# Altium schematic symbol library IC_Maxim.SchLib: 843 symbols (part 4 of 20) (continued)
## MAX4211BETE (continued)

## MAX4211BETE+
designator U?
High-Side Power Monitor, Open-Drain Outputs, 16-Pin TQFN, -40癈 to +85癈, Pb-Free; DatasheetVersion: Rev 1, May-2005; PackageVersion: revK, 2011; PackageReference: T1644+4; PackageDescription: 16-Pin Thin Quad Flatpack, No-Leads (TQFN), 4 x 4 x 0.75 mm Body, 0.65 mm Pitch, Exposed Pad, Pb-Free; Code_JEDEC: MO-220WGGC; ComponentLink1Description: Manufacturer URL; ComponentLink1URL: http://www.maxim-ic.com; ComponentLink2Description: Datasheet; ComponentLink2URL: http://datasheets.maxim-ic.com/en/ds/MAX4210-MAX4211.pdf; ComponentLink3Description: Package Specification; ComponentLink3URL: http://pdfserv.maxim-ic.com/package_dwgs/21-0139.PDF
footprint QFN16_0.65-PAD(4x4) (Footprint not found)
pins: 1 VCC (power), 2 NC, 3 LE (in), 4 COUT1 (oc), 5 INHIBIT (in), 6 COUT2 (oc), 7 GND (power), 8 CIN2+ (in), 9 CIN2- (in), 10 CIN1+ (in), 11 CIN1- (in), 12 REF (out), 13 POUT (out), 14 IOUT (out), 15 RS- (in), 16 RS+ (in), 17 EP (power)

## MAX4211BEUE
designator U?
High-Side, Power + Current Monitor with 2 Comparators + Reference, 25 V / V Gain, -40 to 85 degC, 16-Pin SOP (U16-2); PartNumber: MAX4211BEUE; Bi-Dir. Curr. Sense: No; Gain: 16.67 V/V, 25 V/V ,40.96 V/V; DatasheetVersion: Rev. 1; PackageVersion: Rev. L, 07/2010; PackageReference: U16-2; PackageDescription: 16-Pin Thin Shrink Small-Outline Package, Body 4.4 x 5 mm, Pitch 0.65 mm; Supplier Part Number 1: MAX4211BEUE-ND; Supplier Part Number 2: 700-MAX4211BEUE-NR; Mounting Technology: Surface Mount; Code_JEDEC: MO-153; ComponentLink1Description: Manufacturer URL; ComponentLink1URL: http://www.maximintegrated.com/; ComponentLink2Description: Datasheet; ComponentLink2URL: http://datasheets.maximintegrated.com/en/ds/MAX4210-MAX4211.pdf; ComponentLink3Description: Package Specification; ComponentLink3URL: http://pdfserv.maximintegrated.com/package_dwgs/21-0066.PDF
footprint TSSOP16_0.65 (Footprint not found)
pins: 1 RS- (in) "Load-Side Connection for External-Sense Resistor", 2 RS+ (in) "Power Connection to External-Sense Resistor and Internal Resistor-Divider", 3 VCC (power) "Power-Supply Voltage. Connect a 0.1礔 bypass capacitor from VCC to GND.", 4 NC "No Connection. Not internally connected.", 5 LE (in) "Latch Enable for Comparator 1. Driving logic low makes the comparator transparent (regular comparator). Driving logic high latches the output.", 6 COUT1 (oc) "Open- Drain Comparator 1 Output. LE  and  INHIBIT control  the comparator 1 output.", 7 INHIBIT (in) "INHIBIT for Comparator 1 Output. Driving logic high inhibits the comparator operation. Drive logic low for normal operation.", 8 COUT2 (oc) "Open-Drain Comparator 2 Output", 9 GND (power) "Ground", 10 CIN2+ (in) "Comparator 2 Positive Input", 11 CIN2- (in) "Comparator 2 Negative Input", 12 CIN1+ (in) "Comparator 1 Positive Input", 13 CIN1- (in) "Comparator 1 Negative Input", 14 REF (out) "1.21V Internal Reference Output", 15 POUT (power) "Power Output Voltage. Voltage output proportional to source power (input voltage multiplied by load current).", 16 IOUT (out) "Current Output Voltage. Voltage output proportional to VSENSE (VRS+ - VRS-) load current."

## MAX4211BEUE+
designator U?
High-Side Power Monitor, Open-Drain Outputs, 16-Pin TSSOP, -40癈 to +85癈, Pb-Free; DatasheetVersion: Rev 1, May-2005; PackageVersion: revL, 2010; PackageReference: U16+2; PackageDescription: 16-Pin Thin Shrink Small-Outline Package, 4.4 mm Body, TSSOP, Pb-Free; Code_JEDEC: MO-153-AB; ComponentLink1Description: Manufacturer URL; ComponentLink1URL: http://www.maxim-ic.com; ComponentLink2Description: Datasheet; ComponentLink2URL: http://datasheets.maxim-ic.com/en/ds/MAX4210-MAX4211.pdf; ComponentLink3Description: Package Specification; ComponentLink3URL: http://pdfserv.maxim-ic.com/package_dwgs/21-0066.PDF
footprint TSSOP16_0.65 (Footprint not found)
pins: 1 RS- (in), 2 RS+ (in), 3 VCC (power), 4 NC, 5 LE (in), 6 COUT1 (oc), 7 INHIBIT (in), 8 COUT2 (oc), 9 GND (power), 10 CIN2+ (in), 11 CIN2- (in), 12 CIN1+ (in), 13 CIN1- (in), 14 REF (out), 15 POUT (out), 16 IOUT (out)

## MAX4211CETE
designator U?
High-Side Power Monitor, Open-Drain Outputs, 16-Pin TQFN, -40癈 to +85癈; DatasheetVersion: Rev 1, May-2005; PackageVersion: revJ, 2011; PackageReference: T1644-4; PackageDescription: 16-Pin Thin Quad Flatpack, No-Leads (TQFN), 4 x 4 x 0.75 mm Body, 0.65 mm Pitch, Exposed Pad; Code_JEDEC: MO-220WGGC; ComponentLink1Description: Manufacturer URL; ComponentLink1URL: http://www.maxim-ic.com; ComponentLink2Description: Datasheet; ComponentLink2URL: http://datasheets.maxim-ic.com/en/ds/MAX4210-MAX4211.pdf; ComponentLink3Description: Package Specification; ComponentLink3URL: http://pdfserv.maxim-ic.com/package_dwgs/21-0139.PDF
footprint QFN16_0.65-PAD(4x4) (Footprint not found)
pins: 1 VCC (power), 2 NC, 3 LE (in), 4 COUT1 (oc), 5 INHIBIT (in), 6 COUT2 (oc), 7 GND (power), 8 CIN2+ (in), 9 CIN2- (in), 10 CIN1+ (in), 11 CIN1- (in), 12 REF (out), 13 POUT (out), 14 IOUT (out), 15 RS- (in), 16 RS+ (in), 17 EP (power)

## MAX4211CETE+
designator U?
High-Side Power Monitor, Open-Drain Outputs, 16-Pin TQFN, -40癈 to +85癈, Pb-Free; DatasheetVersion: Rev 1, May-2005; PackageVersion: revK, 2011; PackageReference: T1644+4; PackageDescription: 16-Pin Thin Quad Flatpack, No-Leads (TQFN), 4 x 4 x 0.75 mm Body, 0.65 mm Pitch, Exposed Pad, Pb-Free; Code_JEDEC: MO-220WGGC; ComponentLink1Description: Manufacturer URL; ComponentLink1URL: http://www.maxim-ic.com; ComponentLink2Description: Datasheet; ComponentLink2URL: http://datasheets.maxim-ic.com/en/ds/MAX4210-MAX4211.pdf; ComponentLink3Description: Package Specification; ComponentLink3URL: http://pdfserv.maxim-ic.com/package_dwgs/21-0139.PDF
footprint QFN16_0.65-PAD(4x4) (Footprint not found)
pins: 1 VCC (power), 2 NC, 3 LE (in), 4 COUT1 (oc), 5 INHIBIT (in), 6 COUT2 (oc), 7 GND (power), 8 CIN2+ (in), 9 CIN2- (in), 10 CIN1+ (in), 11 CIN1- (in), 12 REF (out), 13 POUT (out), 14 IOUT (out), 15 RS- (in), 16 RS+ (in), 17 EP (power)

## MAX4211CEUE
designator U?
High-Side Power Monitor, Open-Drain Outputs, 16-Pin TSSOP, -40癈 to +85癈; DatasheetVersion: Rev 1, May-2005; PackageVersion: revL, 2010; PackageReference: U16-2; PackageDescription: 16-Pin Thin Shrink Small-Outline Package, 4.4 mm Body, TSSOP; Code_JEDEC: MO-153-AB; ComponentLink1Description: Manufacturer URL; ComponentLink1URL: http://www.maxim-ic.com; ComponentLink2Description: Datasheet; ComponentLink2URL: http://datasheets.maxim-ic.com/en/ds/MAX4210-MAX4211.pdf; ComponentLink3Description: Package Specification; ComponentLink3URL: http://pdfserv.maxim-ic.com/package_dwgs/21-0066.PDF
footprint TSSOP16_0.65 (Footprint not found)
pins: 1 RS- (in), 2 RS+ (in), 3 VCC (power), 4 NC, 5 LE (in), 6 COUT1 (oc), 7 INHIBIT (in), 8 COUT2 (oc), 9 GND (power), 10 CIN2+ (in), 11 CIN2- (in), 12 CIN1+ (in), 13 CIN1- (in), 14 REF (out), 15 POUT (out), 16 IOUT (out)

## MAX4211CEUE+
designator U?
High-Side Power Monitor, Open-Drain Outputs, 16-Pin TSSOP, -40癈 to +85癈, Pb-Free; DatasheetVersion: Rev 1, May-2005; PackageVersion: revL, 2010; PackageReference: U16+2; PackageDescription: 16-Pin Thin Shrink Small-Outline Package, 4.4 mm Body, TSSOP, Pb-Free; Code_JEDEC: MO-153-AB; ComponentLink1Description: Manufacturer URL; ComponentLink1URL: http://www.maxim-ic.com; ComponentLink2Description: Datasheet; ComponentLink2URL: http://datasheets.maxim-ic.com/en/ds/MAX4210-MAX4211.pdf; ComponentLink3Description: Package Specification; ComponentLink3URL: http://pdfserv.maxim-ic.com/package_dwgs/21-0066.PDF
footprint TSSOP16_0.65 (Footprint not found)
pins: 1 RS- (in), 2 RS+ (in), 3 VCC (power), 4 NC, 5 LE (in), 6 COUT1 (oc), 7 INHIBIT (in), 8 COUT2 (oc), 9 GND (power), 10 CIN2+ (in), 11 CIN2- (in), 12 CIN1+ (in), 13 CIN1- (in), 14 REF (out), 15 POUT (out), 16 IOUT (out)

## MAX4211DETE
designator U?
High-Side Power Monitor, Open-Drain Outputs, 16-Pin TQFN, -40癈 to +85癈; DatasheetVersion: Rev 1, May-2005; PackageVersion: revJ, 2011; PackageReference: T1644-4; PackageDescription: 16-Pin Thin Quad Flatpack, No-Leads (TQFN), 4 x 4 x 0.75 mm Body, 0.65 mm Pitch, Exposed Pad; Code_JEDEC: MO-220WGGC; ComponentLink1Description: Manufacturer URL; ComponentLink1URL: http://www.maxim-ic.com; ComponentLink2Description: Datasheet; ComponentLink2URL: http://datasheets.maxim-ic.com/en/ds/MAX4210-MAX4211.pdf; ComponentLink3Description: Package Specification; ComponentLink3URL: http://pdfserv.maxim-ic.com/package_dwgs/21-0139.PDF
footprint QFN16_0.65-PAD(4x4) (Footprint not found)
pins: 1 VCC (power), 2 IN (in), 3 LE (in), 4 COUT1 (oc), 5 INHIBIT (in), 6 COUT2 (oc), 7 GND (power), 8 CIN2+ (in), 9 CIN2- (in), 10 CIN1+ (in), 11 CIN1- (in), 12 REF (out), 13 POUT (out), 14 IOUT (out), 15 RS- (in), 16 RS+ (in), 17 EP (power)

## MAX4211DETE+
designator U?
High-Side Power Monitor, Open-Drain Outputs, 16-Pin TQFN, -40癈 to +85癈, Pb-Free; DatasheetVersion: Rev 1, May-2005; PackageVersion: revK, 2011; PackageReference: T1644+4; PackageDescription: 16-Pin Thin Quad Flatpack, No-Leads (TQFN), 4 x 4 x 0.75 mm Body, 0.65 mm Pitch, Exposed Pad, Pb-Free; Code_JEDEC: MO-220WGGC; ComponentLink1Description: Manufacturer URL; ComponentLink1URL: http://www.maxim-ic.com; ComponentLink2Description: Datasheet; ComponentLink2URL: http://datasheets.maxim-ic.com/en/ds/MAX4210-MAX4211.pdf; ComponentLink3Description: Package Specification; ComponentLink3URL: http://pdfserv.maxim-ic.com/package_dwgs/21-0139.PDF
footprint QFN16_0.65-PAD(4x4) (Footprint not found)
pins: 1 VCC (power), 2 IN (in), 3 LE (in), 4 COUT1 (oc), 5 INHIBIT (in), 6 COUT2 (oc), 7 GND (power), 8 CIN2+ (in), 9 CIN2- (in), 10 CIN1+ (in), 11 CIN1- (in), 12 REF (out), 13 POUT (out), 14 IOUT (out), 15 RS- (in), 16 RS+ (in), 17 EP (power)

## MAX4211DEUE
designator U?
High-Side Power Monitor, Open-Drain Outputs, 16-Pin TSSOP, -40癈 to +85癈; DatasheetVersion: Rev 1, May-2005; PackageVersion: revL, 2010; PackageReference: U16-2; PackageDescription: 16-Pin Thin Shrink Small-Outline Package, 4.4 mm Body, TSSOP; Code_JEDEC: MO-153-AB; ComponentLink1Description: Manufacturer URL; ComponentLink1URL: http://www.maxim-ic.com; ComponentLink2Description: Datasheet; ComponentLink2URL: http://datasheets.maxim-ic.com/en/ds/MAX4210-MAX4211.pdf; ComponentLink3Description: Package Specification; ComponentLink3URL: http://pdfserv.maxim-ic.com/package_dwgs/21-0066.PDF
footprint TSSOP16_0.65 (Footprint not found)
pins: 1 RS- (in), 2 RS+ (in), 3 VCC (power), 4 IN (in), 5 LE (in), 6 COUT1 (oc), 7 INHIBIT (in), 8 COUT2 (oc), 9 GND (power), 10 CIN2+ (in), 11 CIN2- (in), 12 CIN1+ (in), 13 CIN1- (in), 14 REF (out), 15 POUT (out), 16 IOUT (out)

## MAX4211EETE
designator U?
High-Side Power Monitor, Open-Drain Outputs, 16-Pin TQFN, -40癈 to +85癈; DatasheetVersion: Rev 1, May-2005; PackageVersion: revJ, 2011; PackageReference: T1644-4; PackageDescription: 16-Pin Thin Quad Flatpack, No-Leads (TQFN), 4 x 4 x 0.75 mm Body, 0.65 mm Pitch, Exposed Pad; Code_JEDEC: MO-220WGGC; ComponentLink1Description: Manufacturer URL; ComponentLink1URL: http://www.maxim-ic.com; ComponentLink2Description: Datasheet; ComponentLink2URL: http://datasheets.maxim-ic.com/en/ds/MAX4210-MAX4211.pdf; ComponentLink3Description: Package Specification; ComponentLink3URL: http://pdfserv.maxim-ic.com/package_dwgs/21-0139.PDF
footprint QFN16_0.65-PAD(4x4) (Footprint not found)
pins: 1 VCC (power), 2 IN (in), 3 LE (in), 4 COUT1 (oc), 5 INHIBIT (in), 6 COUT2 (oc), 7 GND (power), 8 CIN2+ (in), 9 CIN2- (in), 10 CIN1+ (in), 11 CIN1- (in), 12 REF (out), 13 POUT (out), 14 IOUT (out), 15 RS- (in), 16 RS+ (in), 17 EP (power)

## MAX4211EETE+
designator U?
High-Side Power Monitor, Open-Drain Outputs, 16-Pin TQFN, -40癈 to +85癈, Pb-Free; DatasheetVersion: Rev 1, May-2005; PackageVersion: revK, 2011; PackageReference: T1644+4; PackageDescription: 16-Pin Thin Quad Flatpack, No-Leads (TQFN), 4 x 4 x 0.75 mm Body, 0.65 mm Pitch, Exposed Pad, Pb-Free; Code_JEDEC: MO-220WGGC; ComponentLink1Description: Manufacturer URL; ComponentLink1URL: http://www.maxim-ic.com; ComponentLink2Description: Datasheet; ComponentLink2URL: http://datasheets.maxim-ic.com/en/ds/MAX4210-MAX4211.pdf; ComponentLink3Description: Package Specification; ComponentLink3URL: http://pdfserv.maxim-ic.com/package_dwgs/21-0139.PDF
footprint QFN16_0.65-PAD(4x4) (Footprint not found)
pins: 1 VCC (power), 2 IN (in), 3 LE (in), 4 COUT1 (oc), 5 INHIBIT (in), 6 COUT2 (oc), 7 GND (power), 8 CIN2+ (in), 9 CIN2- (in), 10 CIN1+ (in), 11 CIN1- (in), 12 REF (out), 13 POUT (out), 14 IOUT (out), 15 RS- (in), 16 RS+ (in), 17 EP (power)

## MAX4211EEUE
designator U?
High-Side Power Monitor, Open-Drain Outputs, 16-Pin TSSOP, -40癈 to +85癈; DatasheetVersion: Rev 1, May-2005; PackageVersion: revL, 2010; PackageReference: U16-2; PackageDescription: 16-Pin Thin Shrink Small-Outline Package, 4.4 mm Body, TSSOP; Code_JEDEC: MO-153-AB; ComponentLink1Description: Manufacturer URL; ComponentLink1URL: http://www.maxim-ic.com; ComponentLink2Description: Datasheet; ComponentLink2URL: http://datasheets.maxim-ic.com/en/ds/MAX4210-MAX4211.pdf; ComponentLink3Description: Package Specification; ComponentLink3URL: http://pdfserv.maxim-ic.com/package_dwgs/21-0066.PDF
footprint TSSOP16_0.65 (Footprint not found)
pins: 1 RS- (in), 2 RS+ (in), 3 VCC (power), 4 IN (in), 5 LE (in), 6 COUT1 (oc), 7 INHIBIT (in), 8 COUT2 (oc), 9 GND (power), 10 CIN2+ (in), 11 CIN2- (in), 12 CIN1+ (in), 13 CIN1- (in), 14 REF (out), 15 POUT (out), 16 IOUT (out)

## MAX4211EEUE+
designator U?
High-Side Power Monitor, Open-Drain Outputs, 16-Pin TSSOP, -40癈 to +85癈, Pb-Free; DatasheetVersion: Rev 1, May-2005; PackageVersion: revL, 2010; PackageReference: U16+2; PackageDescription: 16-Pin Thin Shrink Small-Outline Package, 4.4 mm Body, TSSOP, Pb-Free; Code_JEDEC: MO-153-AB; ComponentLink1Description: Manufacturer URL; ComponentLink1URL: http://www.maxim-ic.com; ComponentLink2Description: Datasheet; ComponentLink2URL: http://datasheets.maxim-ic.com/en/ds/MAX4210-MAX4211.pdf; ComponentLink3Description: Package Specification; ComponentLink3URL: http://pdfserv.maxim-ic.com/package_dwgs/21-0066.PDF
footprint TSSOP16_0.65 (Footprint not found)
pins: 1 RS- (in), 2 RS+ (in), 3 VCC (power), 4 IN (in), 5 LE (in), 6 COUT1 (oc), 7 INHIBIT (in), 8 COUT2 (oc), 9 GND (power), 10 CIN2+ (in), 11 CIN2- (in), 12 CIN1+ (in), 13 CIN1- (in), 14 REF (out), 15 POUT (out), 16 IOUT (out)

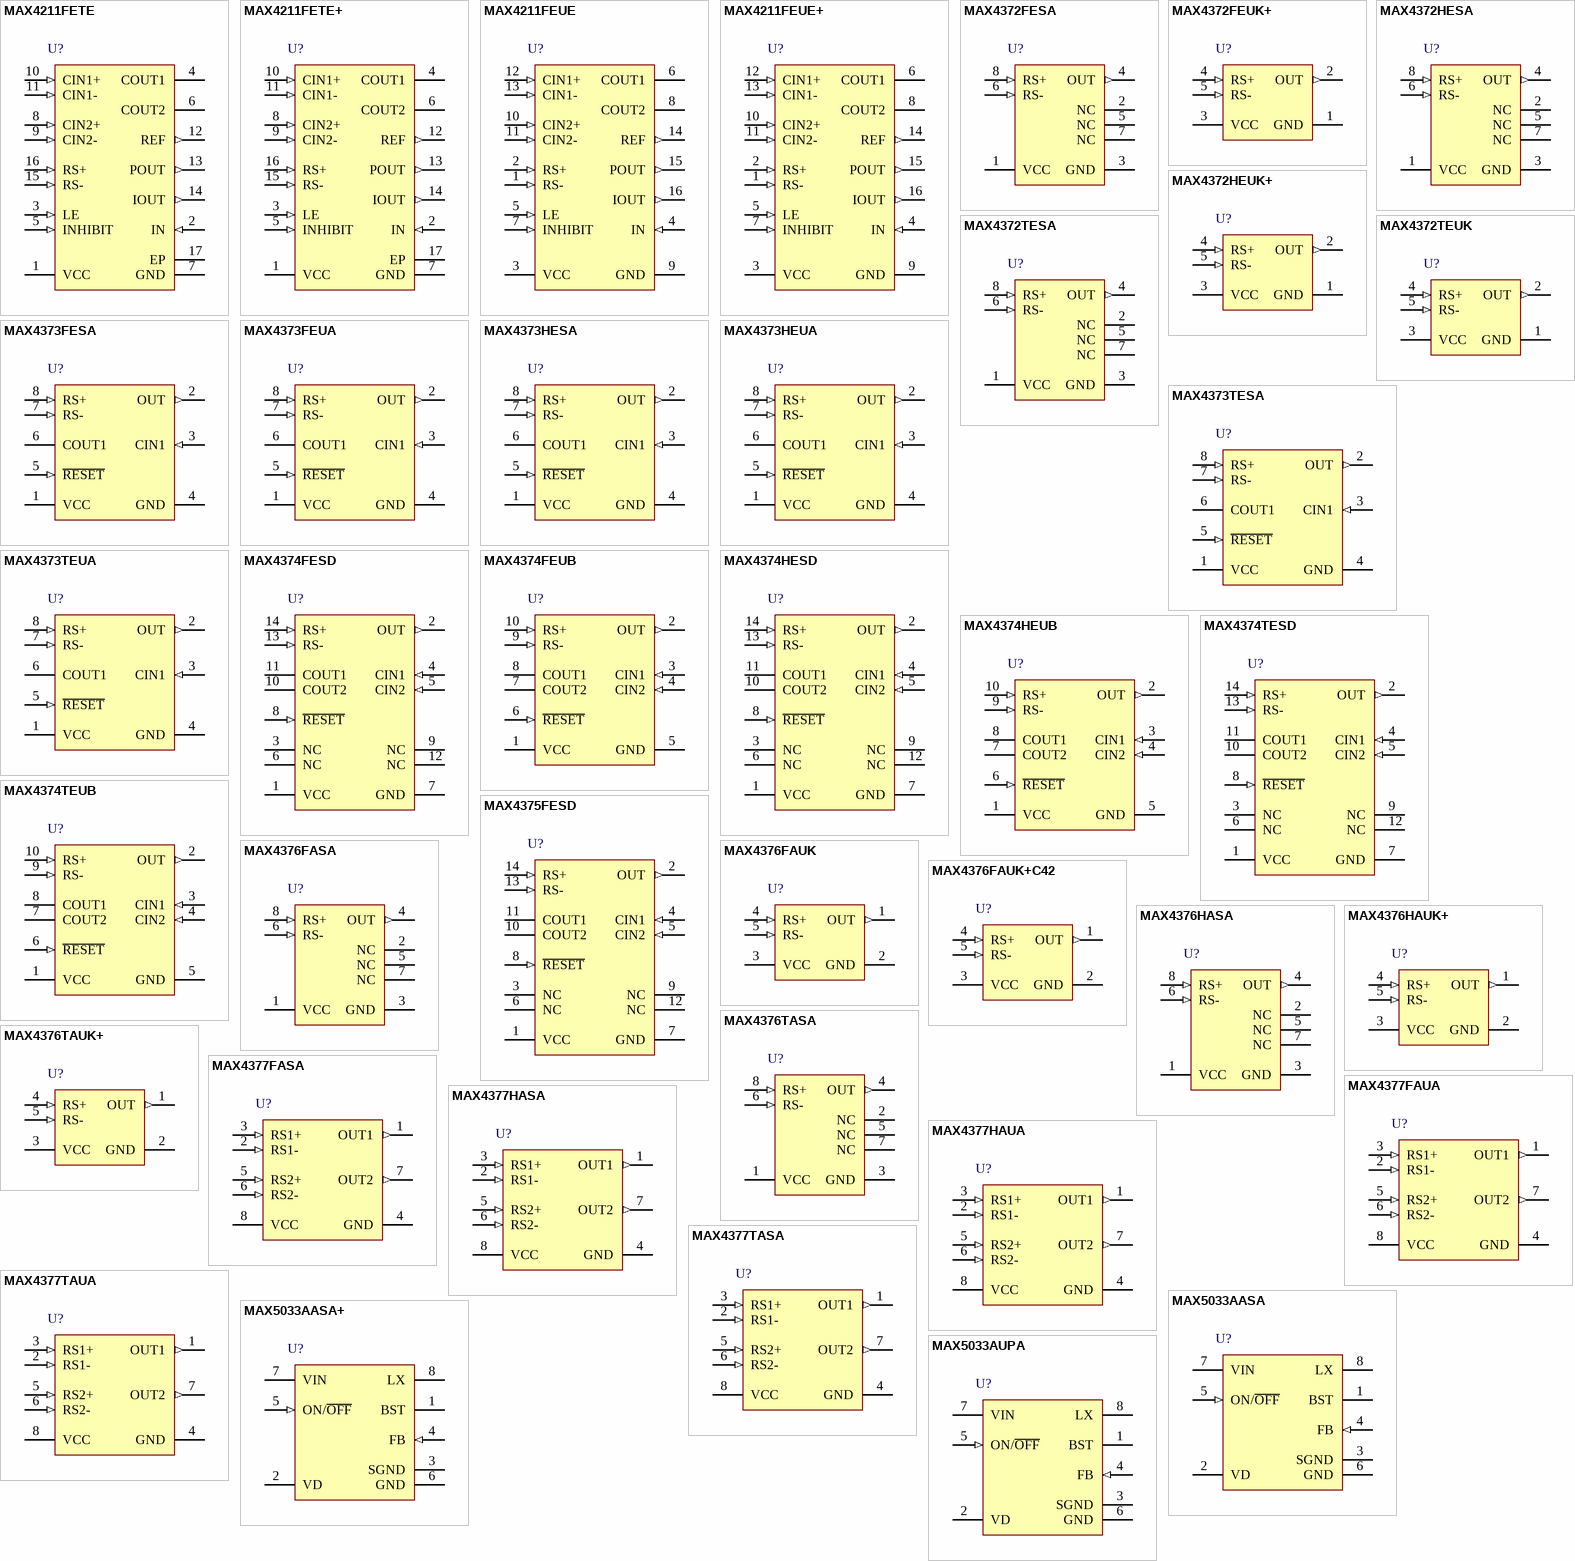
[diagram p5: symbols MAX4211FETE to MAX5033AUPA]

## MAX4211FETE
designator U?
High-Side Power Monitor, Open-Drain Outputs, 16-Pin TQFN, -40癈 to +85癈; DatasheetVersion: Rev 1, May-2005; PackageVersion: revJ, 2011; PackageReference: T1644-4; PackageDescription: 16-Pin Thin Quad Flatpack, No-Leads (TQFN), 4 x 4 x 0.75 mm Body, 0.65 mm Pitch, Exposed Pad; Code_JEDEC: MO-220WGGC; ComponentLink1Description: Manufacturer URL; ComponentLink1URL: http://www.maxim-ic.com; ComponentLink2Description: Datasheet; ComponentLink2URL: http://datasheets.maxim-ic.com/en/ds/MAX4210-MAX4211.pdf; ComponentLink3Description: Package Specification; ComponentLink3URL: http://pdfserv.maxim-ic.com/package_dwgs/21-0139.PDF
footprint QFN16_0.65-PAD(4x4) (Footprint not found)
pins: 1 VCC (power), 2 IN (in), 3 LE (in), 4 COUT1 (oc), 5 INHIBIT (in), 6 COUT2 (oc), 7 GND (power), 8 CIN2+ (in), 9 CIN2- (in), 10 CIN1+ (in), 11 CIN1- (in), 12 REF (out), 13 POUT (out), 14 IOUT (out), 15 RS- (in), 16 RS+ (in), 17 EP (power)

## MAX4211FETE+
designator U?
High-Side Power Monitor, Open-Drain Outputs, 16-Pin TQFN, -40癈 to +85癈, Pb-Free; DatasheetVersion: Rev 1, May-2005; PackageVersion: revK, 2011; PackageReference: T1644+4; PackageDescription: 16-Pin Thin Quad Flatpack, No-Leads (TQFN), 4 x 4 x 0.75 mm Body, 0.65 mm Pitch, Exposed Pad, Pb-Free; Code_JEDEC: MO-220WGGC; ComponentLink1Description: Manufacturer URL; ComponentLink1URL: http://www.maxim-ic.com; ComponentLink2Description: Datasheet; ComponentLink2URL: http://datasheets.maxim-ic.com/en/ds/MAX4210-MAX4211.pdf; ComponentLink3Description: Package Specification; ComponentLink3URL: http://pdfserv.maxim-ic.com/package_dwgs/21-0139.PDF
footprint QFN16_0.65-PAD(4x4) (Footprint not found)
pins: 1 VCC (power), 2 IN (in), 3 LE (in), 4 COUT1 (oc), 5 INHIBIT (in), 6 COUT2 (oc), 7 GND (power), 8 CIN2+ (in), 9 CIN2- (in), 10 CIN1+ (in), 11 CIN1- (in), 12 REF (out), 13 POUT (out), 14 IOUT (out), 15 RS- (in), 16 RS+ (in), 17 EP (power)

## MAX4211FEUE
designator U?
High-Side Power Monitor, Open-Drain Outputs, 16-Pin TSSOP, -40癈 to +85癈; DatasheetVersion: Rev 1, May-2005; PackageVersion: revL, 2010; PackageReference: U16-2; PackageDescription: 16-Pin Thin Shrink Small-Outline Package, 4.4 mm Body, TSSOP; Code_JEDEC: MO-153-AB; ComponentLink1Description: Manufacturer URL; ComponentLink1URL: http://www.maxim-ic.com; ComponentLink2Description: Datasheet; ComponentLink2URL: http://datasheets.maxim-ic.com/en/ds/MAX4210-MAX4211.pdf; ComponentLink3Description: Package Specification; ComponentLink3URL: http://pdfserv.maxim-ic.com/package_dwgs/21-0066.PDF
footprint TSSOP16_0.65 (Footprint not found)
pins: 1 RS- (in), 2 RS+ (in), 3 VCC (power), 4 IN (in), 5 LE (in), 6 COUT1 (oc), 7 INHIBIT (in), 8 COUT2 (oc), 9 GND (power), 10 CIN2+ (in), 11 CIN2- (in), 12 CIN1+ (in), 13 CIN1- (in), 14 REF (out), 15 POUT (out), 16 IOUT (out)

## MAX4211FEUE+
designator U?
High-Side Power Monitor, Open-Drain Outputs, 16-Pin TSSOP, -40癈 to +85癈, Pb-Free; DatasheetVersion: Rev 1, May-2005; PackageVersion: revL, 2010; PackageReference: U16+2; PackageDescription: 16-Pin Thin Shrink Small-Outline Package, 4.4 mm Body, TSSOP, Pb-Free; Code_JEDEC: MO-153-AB; ComponentLink1Description: Manufacturer URL; ComponentLink1URL: http://www.maxim-ic.com; ComponentLink2Description: Datasheet; ComponentLink2URL: http://datasheets.maxim-ic.com/en/ds/MAX4210-MAX4211.pdf; ComponentLink3Description: Package Specification; ComponentLink3URL: http://pdfserv.maxim-ic.com/package_dwgs/21-0066.PDF
footprint TSSOP16_0.65 (Footprint not found)
pins: 1 RS- (in), 2 RS+ (in), 3 VCC (power), 4 IN (in), 5 LE (in), 6 COUT1 (oc), 7 INHIBIT (in), 8 COUT2 (oc), 9 GND (power), 10 CIN2+ (in), 11 CIN2- (in), 12 CIN1+ (in), 13 CIN1- (in), 14 REF (out), 15 POUT (out), 16 IOUT (out)

## MAX4372FESA
designator U?
Micropower, Voltage-Output, High-Side, Current-Sense Amplifier, 50 V / V Gain, -40 to +85 degC, 8-Pin SOIC (S8-2); PartNumber: MAX4372FESA; Bi-Dir. Curr. Sense: No; Gain: 20 V/V, 50 V/V ,100 V/V; DatasheetVersion: Rev. 5; PackageVersion: Rev. D, 10/2012; PackageReference: S8-2; PackageDescription: 8-Pin Small-Outline IC, Narrow (0.15in) (S8-2), Body 4.90 x 3.90 mm, Pitch 1.27 mm; Supplier Part Number 1: MAX4372FESA-ND; Supplier Part Number 2: 700-MAX4372FESA-NR; Mounting Technology: Surface Mount; Code_JEDEC: MS012; ComponentLink1Description: Manufacturer URL; ComponentLink1URL: http://www.maximintegrated.com/; ComponentLink2Description: Datasheet; ComponentLink2URL: http://datasheets.maximintegrated.com/en/ds/MAX4372-MAX4372T.pdf; ComponentLink3Description: Package Specification; ComponentLink3URL: http://pdfserv.maximintegrated.com/package_dwgs/21-0041.PDF
footprint SOIC8_1.27 (Footprint not found)
pins: 1 VCC (power) "Supply Voltage. Use at least a 0.1uF capacitor to decouple VCC from fast transients", 2 NC "No Connection. Not internally connected.", 3 GND (power) "Ground", 4 OUT (out) "Output Voltage. VOUT is proportional to the magnitude of VSENSE (VRS+ - VRS-).", 5 NC "No Connection. Not internally connected.", 6 RS- (in) "Load connection to the external sense resistor.", 7 NC "No Connection. Not internally connected.", 8 RS+ (in) "Power connection to the external-sense resistor."

## MAX4372FEUK+
designator U?
Micropower, Voltage-Output, High-Side, Current-Sense Amplifier, 50 V / V Gain, -40 to +85 degC, 5-Pin SOT23 (U5+1), Pb-Free; PartNumber: MAX4372FEUK+; Bi-Dir. Curr. Sense: No; Gain: 20 V/V, 50 V/V ,100 V/V; DatasheetVersion: Rev. 5; PackageVersion: Rev. G, 04/2011; PackageReference: U5+1; PackageDescription: 5-Pin Small-Outline Transistor Package (U5+1), Body 2.90 x 1.625 mm, Pitch 0.95 mm; Supplier Part Number 1: N/A; Mounting Technology: Surface Mount; Code_JEDEC: MO178; ComponentLink1Description: Manufacturer URL; ComponentLink1URL: http://www.maximintegrated.com/; ComponentLink2Description: Datasheet; ComponentLink2URL: http://datasheets.maximintegrated.com/en/ds/MAX4372-MAX4372T.pdf; ComponentLink3Description: Package Specification; ComponentLink3URL: http://pdfserv.maximintegrated.com/package_dwgs/21-0057.PDF
footprint SOT23-5 (Footprint not found)
pins: 1 GND (power) "Ground", 2 OUT (out) "Output Voltage. VOUT is proportional to the magnitude of VSENSE (VRS+ - VRS-).", 3 VCC (power) "Supply Voltage. Use at least a 0.1 uF capacitor to decouple VCC from fast transients.", 4 RS+ (in) "Power connection to the external sense resistor", 5 RS- (in) "Load-side connection to the external sense resistor"

## MAX4372HESA
designator U?
Micropower, Voltage-Output, High-Side, Current-Sense Amplifier, 100 V / V Gain, -40 to +85 degC, 8-Pin SOIC (S8-2); PartNumber: MAX4372HESA; Bi-Dir. Curr. Sense: No; Gain: 20 V/V, 50 V/V ,100 V/V; DatasheetVersion: Rev. 5; PackageVersion: Rev. D, 10/2012; PackageReference: S8-2; PackageDescription: 8-Pin Small-Outline IC, Narrow (0.15in) (S8-2), Body 4.90 x 3.90 mm, Pitch 1.27 mm; Supplier Part Number 1: MAX4372HESA-ND; Supplier Part Number 2: 700-MAX4372HESA-NR; Mounting Technology: Surface Mount; Code_JEDEC: MS012; ComponentLink1Description: Manufacturer URL; ComponentLink1URL: http://www.maximintegrated.com/; ComponentLink2Description: Datasheet; ComponentLink2URL: http://datasheets.maximintegrated.com/en/ds/MAX4372-MAX4372T.pdf; ComponentLink3Description: Package Specification; ComponentLink3URL: http://pdfserv.maximintegrated.com/package_dwgs/21-0041.PDF
footprint SOIC8_1.27 (Footprint not found)
pins: 1 VCC (power) "Supply Voltage. Use at least a 0.1uF capacitor to decouple VCC from fast transients", 2 NC "No Connection. Not internally connected.", 3 GND (power) "Ground", 4 OUT (out) "Output Voltage. VOUT is proportional to the magnitude of VSENSE (VRS+ - VRS-).", 5 NC "No Connection. Not internally connected.", 6 RS- (in) "Load connection to the external sense resistor.", 7 NC "No Connection. Not internally connected.", 8 RS+ (in) "Power connection to the external-sense resistor."

## MAX4372HEUK+
designator U?
Micropower, Voltage-Output, High-Side, Current-Sense Amplifier, 100 V / V Gain, -40 to +85 degC, 5-Pin SOT23 (U5+1), Pb-Free; PartNumber: MAX4372HEUK+; Bi-Dir. Curr. Sense: No; Gain: 20 V/V, 50 V/V ,100 V/V; DatasheetVersion: Rev. 5; PackageVersion: Rev. G, 04/2011; PackageReference: U5+1; PackageDescription: 5-Pin Small-Outline Transistor Package (U5+1), Body 2.90 x 1.625 mm, Pitch 0.95 mm; Supplier Part Number 1: N/A; Mounting Technology: Surface Mount; Code_JEDEC: MO178; ComponentLink1Description: Manufacturer URL; ComponentLink1URL: http://www.maximintegrated.com/; ComponentLink2Description: Datasheet; ComponentLink2URL: http://datasheets.maximintegrated.com/en/ds/MAX4372-MAX4372T.pdf; ComponentLink3Description: Package Specification; ComponentLink3URL: http://pdfserv.maximintegrated.com/package_dwgs/21-0057.PDF
footprint SOT23-5 (Footprint not found)
pins: 1 GND (power) "Ground", 2 OUT (out) "Output Voltage. VOUT is proportional to the magnitude of VSENSE (VRS+ - VRS-).", 3 VCC (power) "Supply Voltage. Use at least a 0.1 uF capacitor to decouple VCC from fast transients.", 4 RS+ (in) "Power connection to the external sense resistor", 5 RS- (in) "Load-side connection to the external sense resistor"

## MAX4372TESA
designator U?
Micropower, Voltage-Output, High-Side, Current-Sense Amplifier, 20 V / V Gain, -40 to +85 degC, 8-Pin SOIC (S8-2); PartNumber: MAX4372TESA; Bi-Dir. Curr. Sense: No; Gain: 20 V/V, 50 V/V ,100 V/V; DatasheetVersion: Rev. 5; PackageVersion: Rev. D, 10/2012; PackageReference: S8-2; PackageDescription: 8-Pin Small-Outline IC, Narrow (0.15in) (S8-2), Body 4.90 x 3.90 mm, Pitch 1.27 mm; Supplier Part Number 1: N/A; Mounting Technology: Surface Mount; Code_JEDEC: MS012; ComponentLink1Description: Manufacturer URL; ComponentLink1URL: http://www.maximintegrated.com/; ComponentLink2Description: Datasheet; ComponentLink2URL: http://datasheets.maximintegrated.com/en/ds/MAX4372-MAX4372T.pdf; ComponentLink3Description: Package Specification; ComponentLink3URL: http://pdfserv.maximintegrated.com/package_dwgs/21-0041.PDF
footprint SOIC8_1.27 (Footprint not found)
pins: 1 VCC (power) "Supply Voltage. Use at least a 0.1uF capacitor to decouple VCC from fast transients", 2 NC "No Connection. Not internally connected.", 3 GND (power) "Ground", 4 OUT (out) "Output Voltage. VOUT is proportional to the magnitude of VSENSE (VRS+ - VRS-).", 5 NC "No Connection. Not internally connected.", 6 RS- (in) "Load connection to the external sense resistor.", 7 NC "No Connection. Not internally connected.", 8 RS+ (in) "Power connection to the external-sense resistor."

## MAX4372TEUK
designator U?
Micropower, Voltage-Output, High-Side, Current-Sense Amplifier, 20 V / V Gain, -40 to +85 degC, 5-Pin SOT23 (U5-1); PartNumber: MAX4372TEUK; Bi-Dir. Curr. Sense: No; Gain: 20 V/V, 50 V/V ,100 V/V; DatasheetVersion: Rev. 5; PackageVersion: Rev. G, 04/2011; PackageReference: U5-1; PackageDescription: 5-Pin Small-Outline Transistor Package (U5-1), Body 2.9 x 1.625 mm, Pitch 0.95 mm; Supplier Part Number 1: N/A; Mounting Technology: Surface Mount; Code_JEDEC: MO178; ComponentLink1Description: Manufacturer URL; ComponentLink1URL: http://www.maximintegrated.com/; ComponentLink2Description: Datasheet; ComponentLink2URL: http://datasheets.maximintegrated.com/en/ds/MAX4372-MAX4372T.pdf; ComponentLink3Description: Package Specification; ComponentLink3URL: http://pdfserv.maximintegrated.com/package_dwgs/21-0057.PDF
footprint SOT23-5 (Footprint not found)
pins: 1 GND (power) "Ground", 2 OUT (out) "Output Voltage. VOUT is proportional to the magnitude of VSENSE (VRS+ - VRS-).", 3 VCC (power) "Supply Voltage. Use at least a 0.1 uF capacitor to decouple VCC from fast transients.", 4 RS+ (in) "Power connection to the external sense resistor", 5 RS- (in) "Load-side connection to the external sense resistor"

## MAX4373FESA
designator U?
Low-cost, Micropower, High-Side Current-Sense Amplifier + Comparator + Reference, 20 V / V Gain, -40 to 85 degC, 8-Pin SOIC (S8-2); PartNumber: MAX4373FESA; Bi-Dir. Curr. Sense: No; Gain: 20 V/V, 50 V/V ,100 V/V; DatasheetVersion: Rev. 4; PackageVersion: Rev. D, 10/2012; PackageReference: S8-2; PackageDescription: 8-Pin Small-Outline IC, Narrow (0.15in) (S8-2), Body 4.90 x 3.90 mm, Pitch 1.27 mm; Supplier Part Number 1: MAX4373FESA-ND; Supplier Part Number 2: 700-MAX4373FESA-NR; Mounting Technology: Surface Mount; Code_JEDEC: MS012; ComponentLink1Description: Manufacturer URL; ComponentLink1URL: http://www.maximintegrated.com/; ComponentLink2Description: Datasheet; ComponentLink2URL: http://datasheets.maximintegrated.com/en/ds/MAX4373-MAX4375.pdf; ComponentLink3Description: Package Specification; ComponentLink3URL: http://pdfserv.maximintegrated.com/package_dwgs/21-0041.PDF
footprint SOIC8_1.27 (Footprint not found)
pins: 1 VCC (power) "Supply Voltage Input", 2 OUT (out) "Voltage Output. VOUT is proportional to VSENSE (VRS+ - VRS-).", 3 CIN1 (in) "Comparator Input 1. Positive input of an internal comparator. The negative terminal is connected to a 0.6V internal reference.", 4 GND (power) "Ground", 5 ~{RESET} (in) "Reset Input. Resets the output latch of the comparator at CIN1.", 6 COUT1 (oc) "Open-Drain Comparator Output. Latching output of the comparator controlled by CIN1. Connect R\E\S\E\T\ to GND to disable the latch.", 7 RS- (in) "Load-Side Connection for the External Sense Resistor", 8 RS+ (in) "Power Connection to the External Sense Resistor"

## MAX4373FEUA
designator U?
Low-cost, Micropower, High-Side Current-Sense Amplifier + Comparator + Reference, 20 V / V Gain, -40 to 85 degC, 8-Pin SOP (U8-1); PartNumber: MAX4373FEUA; Bi-Dir. Curr. Sense: No; Gain: 20 V/V, 50 V/V ,100 V/V; DatasheetVersion: Rev. 4; PackageVersion: Rev. L, 08/2009; PackageReference: U8-1; PackageDescription: 8-Pin Micro-MAX, Thin Shrink Small-Outline (U8-1), Body 3 x 3 mm, Pitch 0.65mm; Supplier Part Number 1: MAX4373FEUA-ND; Supplier Part Number 2: 700-MAX4373FEUA-NR; Mounting Technology: Surface Mount; Code_JEDEC: MO-187; ComponentLink1Description: Manufacturer URL; ComponentLink1URL: http://www.maximintegrated.com/; ComponentLink2Description: Datasheet; ComponentLink2URL: http://datasheets.maximintegrated.com/en/ds/MAX4373-MAX4375.pdf; ComponentLink3Description: Package Specification; ComponentLink3URL: http://pdfserv.maximintegrated.com/package_dwgs/21-0036.PDF
footprint VSSOP8_0.65 (Footprint not found)
pins: 1 VCC (power) "Supply Voltage Input", 2 OUT (out) "Voltage Output. VOUT is proportional to VSENSE (VRS+ - VRS-).", 3 CIN1 (in) "Comparator Input 1. Positive input of an internal comparator. The negative terminal is connected to a 0.6V internal reference.", 4 GND (power) "Ground", 5 ~{RESET} (in) "Reset Input. Resets the output latch of the comparator at CIN1.", 6 COUT1 (oc) "Open-Drain Comparator Output. Latching output of the comparator controlled by CIN1. Connect R\E\S\E\T\ to GND to disable the latch.", 7 RS- (in) "Load-Side Connection for the External Sense Resistor", 8 RS+ (in) "Power Connection to the External Sense Resistor"

## MAX4373HESA
designator U?
Low-cost, Micropower, High-Side Current-Sense Amplifier + Comparator + Reference, 20 V / V Gain, -40 to 85 degC, 8-Pin SOIC (S8-2); PartNumber: MAX4373HESA; Bi-Dir. Curr. Sense: No; Gain: 20 V/V, 50 V/V ,100 V/V; DatasheetVersion: Rev. 4; PackageVersion: Rev. D, 10/2012; PackageReference: S8-2; PackageDescription: 8-Pin Small-Outline IC, Narrow (0.15in) (S8-2), Body 4.90 x 3.90 mm, Pitch 1.27 mm; Supplier Part Number 1: MAX4373HESA-ND; Supplier Part Number 2: 700-MAX4373HESA-NR; Mounting Technology: Surface Mount; Code_JEDEC: MS012; ComponentLink1Description: Manufacturer URL; ComponentLink1URL: http://www.maximintegrated.com/; ComponentLink2Description: Datasheet; ComponentLink2URL: http://datasheets.maximintegrated.com/en/ds/MAX4373-MAX4375.pdf; ComponentLink3Description: Package Specification; ComponentLink3URL: http://pdfserv.maximintegrated.com/package_dwgs/21-0041.PDF
footprint SOIC8_1.27 (Footprint not found)
pins: 1 VCC (power) "Supply Voltage Input", 2 OUT (out) "Voltage Output. VOUT is proportional to VSENSE (VRS+ - VRS-).", 3 CIN1 (in) "Comparator Input 1. Positive input of an internal comparator. The negative terminal is connected to a 0.6V internal reference.", 4 GND (power) "Ground", 5 ~{RESET} (in) "Reset Input. Resets the output latch of the comparator at CIN1.", 6 COUT1 (oc) "Open-Drain Comparator Output. Latching output of the comparator controlled by CIN1. Connect R\E\S\E\T\ to GND to disable the latch.", 7 RS- (in) "Load-Side Connection for the External Sense Resistor", 8 RS+ (in) "Power Connection to the External Sense Resistor"

## MAX4373HEUA
designator U?
Low-cost, Micropower, High-Side Current-Sense Amplifier + Comparator + Reference, 20 V / V Gain, -40 to 85 degC, 8-Pin SOP (U8-1); PartNumber: MAX4373HEUA; Bi-Dir. Curr. Sense: No; Gain: 20 V/V, 50 V/V ,100 V/V; DatasheetVersion: Rev. 4; PackageVersion: Rev. L, 08/2009; PackageReference: U8-1; PackageDescription: 8-Pin Micro-MAX, Thin Shrink Small-Outline (U8-1), Body 3 x 3 mm, Pitch 0.65mm; Supplier Part Number 1: MAX4373HEUA-ND; Supplier Part Number 2: 700-MAX4373HEUA-NR; Mounting Technology: Surface Mount; Code_JEDEC: MO-187; ComponentLink1Description: Manufacturer URL; ComponentLink1URL: http://www.maximintegrated.com/; ComponentLink2Description: Datasheet; ComponentLink2URL: http://datasheets.maximintegrated.com/en/ds/MAX4373-MAX4375.pdf; ComponentLink3Description: Package Specification; ComponentLink3URL: http://pdfserv.maximintegrated.com/package_dwgs/21-0036.PDF
footprint VSSOP8_0.65 (Footprint not found)
pins: 1 VCC (power) "Supply Voltage Input", 2 OUT (out) "Voltage Output. VOUT is proportional to VSENSE (VRS+ - VRS-).", 3 CIN1 (in) "Comparator Input 1. Positive input of an internal comparator. The negative terminal is connected to a 0.6V internal reference.", 4 GND (power) "Ground", 5 ~{RESET} (in) "Reset Input. Resets the output latch of the comparator at CIN1.", 6 COUT1 (oc) "Open-Drain Comparator Output. Latching output of the comparator controlled by CIN1. Connect R\E\S\E\T\ to GND to disable the latch.", 7 RS- (in) "Load-Side Connection for the External Sense Resistor", 8 RS+ (in) "Power Connection to the External Sense Resistor"

## MAX4373TESA
designator U?
Low-cost, Micropower, High-Side Current-Sense Amplifier + Comparator + Reference, 20 V / V Gain, -40 to 85 degC, 8-Pin SOIC (S8-2); PartNumber: MAX4373TESA; Bi-Dir. Curr. Sense: No; Gain: 20 V/V, 50 V/V ,100 V/V; DatasheetVersion: Rev. 4; PackageVersion: Rev. D, 10/2012; PackageReference: S8-2; PackageDescription: 8-Pin Small-Outline IC, Narrow (0.15in) (S8-2), Body 4.90 x 3.90 mm, Pitch 1.27 mm; Supplier Part Number 1: MAX4373TESA-ND; Supplier Part Number 2: 700-MAX4373TESA-NR; Mounting Technology: Surface Mount; Code_JEDEC: MS012; ComponentLink1Description: Manufacturer URL; ComponentLink1URL: http://www.maximintegrated.com/; ComponentLink2Description: Datasheet; ComponentLink2URL: http://datasheets.maximintegrated.com/en/ds/MAX4373-MAX4375.pdf; ComponentLink3Description: Package Specification; ComponentLink3URL: http://pdfserv.maximintegrated.com/package_dwgs/21-0041.PDF
footprint SOIC8_1.27 (Footprint not found)
pins: 1 VCC (power) "Supply Voltage Input", 2 OUT (out) "Voltage Output. VOUT is proportional to VSENSE (VRS+ - VRS-).", 3 CIN1 (in) "Comparator Input 1. Positive input of an internal comparator. The negative terminal is connected to a 0.6V internal reference.", 4 GND (power) "Ground", 5 ~{RESET} (in) "Reset Input. Resets the output latch of the comparator at CIN1.", 6 COUT1 (oc) "Open-Drain Comparator Output. Latching output of the comparator controlled by CIN1. Connect R\E\S\E\T\ to GND to disable the latch.", 7 RS- (in) "Load-Side Connection for the External Sense Resistor", 8 RS+ (in) "Power Connection to the External Sense Resistor"

## MAX4373TEUA
designator U?
Low-cost, Micropower, High-Side Current-Sense Amplifier + Comparator + Reference, 20 V / V Gain, -40 to 85 degC, 8-Pin SOP (U8-1); PartNumber: MAX4373TEUA; Bi-Dir. Curr. Sense: No; Gain: 20 V/V, 50 V/V ,100 V/V; DatasheetVersion: Rev. 4; PackageVersion: Rev. L, 08/2009; PackageReference: U8-1; PackageDescription: 8-Pin Micro-MAX, Thin Shrink Small-Outline (U8-1), Body 3 x 3 mm, Pitch 0.65mm; Supplier Part Number 1: MAX4373TEUA-ND; Supplier Part Number 2: 700-MAX4373TEUA-NR; Mounting Technology: Surface Mount; Code_JEDEC: MO-187; ComponentLink1Description: Manufacturer URL; ComponentLink1URL: http://www.maximintegrated.com/; ComponentLink2Description: Datasheet; ComponentLink2URL: http://datasheets.maximintegrated.com/en/ds/MAX4373-MAX4375.pdf; ComponentLink3Description: Package Specification; ComponentLink3URL: http://pdfserv.maximintegrated.com/package_dwgs/21-0036.PDF
footprint VSSOP8_0.65 (Footprint not found)
pins: 1 VCC (power) "Supply Voltage Input", 2 OUT (out) "Voltage Output. VOUT is proportional to VSENSE (VRS+ - VRS-).", 3 CIN1 (in) "Comparator Input 1. Positive input of an internal comparator. The negative terminal is connected to a 0.6V internal reference.", 4 GND (power) "Ground", 5 ~{RESET} (in) "Reset Input. Resets the output latch of the comparator at CIN1.", 6 COUT1 (oc) "Open-Drain Comparator Output. Latching output of the comparator controlled by CIN1. Connect R\E\S\E\T\ to GND to disable the latch.", 7 RS- (in) "Load-Side Connection for the External Sense Resistor", 8 RS+ (in) "Power Connection to the External Sense Resistor"

## MAX4374FESD
designator U?
Low-cost, Micropower, High-Side Current-Sense Amplifier + 2 Comparators + Reference, 50 V / V Gain, -40 to 85 degC, 14-Pin SOIC (S14-1); PartNumber: MAX4374FESD; Bi-Dir. Curr. Sense: No; Gain: 20 V/V, 50 V/V ,100 V/V; DatasheetVersion: Rev. 4; PackageVersion: Rev. D, 10/2012; PackageReference: S14-1; PackageDescription: 14-Pin Small-Outline IC, Narrow (0.15in), Body 3.9 x 8.65 mm, Pitch 1.27 mm; Supplier Part Number 1: MAX4374FESD-ND; Supplier Part Number 2: 700-MAX4374FESD-NR; Mounting Technology: Surface Mount; Code_JEDEC: MS-012; ComponentLink1Description: Manufacturer URL; ComponentLink1URL: http://www.maximintegrated.com/; ComponentLink2Description: Datasheet; ComponentLink2URL: http://datasheets.maximintegrated.com/en/ds/MAX4373-MAX4375.pdf; ComponentLink3Description: Package Specification; ComponentLink3URL: http://pdfserv.maximintegrated.com/package_dwgs/21-0041.PDF
footprint SOIC14_1.27 (Footprint not found)
pins: 1 VCC (power) "Supply Voltage Input", 2 OUT (out) "Voltage Output. VOUT is proportional to VSENSE (VRS+ - VRS-).", 3 NC "No Connection. Not internally connected.", 4 CIN1 (in) "Comparator Input 1. Positive input of an internal comparator. The negative terminal is connected to a 0.6V internal reference.", 5 CIN2 (in) "Comparator Input 2. Terminal of a second internal comparator. The positive terminal for the MAX4374 and the negative terminal for the MAX4375. The other terminal is connected to a 0.6V internal reference.", 6 NC "No Connection. Not internally connected.", 7 GND (power) "Ground", 8 ~{RESET} (in) "Reset Input. Resets the output latch of the comparator at CIN1.", 9 NC "No Connection. Not internally connected.", 10 COUT2 (oc) "Open-Drain Comparator Output. Output of the second unlatched internal comparator.", 11 COUT1 (oc) "Open-Drain Comparator Output. Latching output of the comparator controlled by CIN1. Connect R\E\S\E\T\ to GND to disable the latch.", 12 NC "No Connection. Not internally connected.", 13 RS- (in) "Load-Side Connection for the External Sense Resistor", 14 RS+ (in) "Power Connection to the External Sense Resistor"

## MAX4374FEUB
designator U?
Low-cost, Micropower, High-Side Current-Sense Amplifier + 2 Comparators + Reference, 50 V / V Gain, -40 to 85 degC, 10-Pin SOP (U10-2); PartNumber: MAX4374FEUB; Bi-Dir. Curr. Sense: No; Gain: 20 V/V, 50 V/V ,100 V/V; DatasheetVersion: Rev. 4; PackageVersion: Rev. L, 07/2008; PackageReference: U10-2; PackageDescription: 10-Pin Micro-MAX, Thin Shrink Small-Outline (U10-2), Body 3 x 3 mm, Pitch 0.5 mm; Supplier Part Number 1: N/A; Mounting Technology: Surface Mount; Code_JEDEC: MO-187; ComponentLink1Description: Manufacturer URL; ComponentLink1URL: http://www.maximintegrated.com/; ComponentLink2Description: Datasheet; ComponentLink2URL: http://datasheets.maximintegrated.com/en/ds/MAX4373-MAX4375.pdf; ComponentLink3Description: Package Specification; ComponentLink3URL: http://pdfserv.maximintegrated.com/package_dwgs/21-0061.PDF
footprint VSSOP10_0.5 (Footprint not found)
pins: 1 VCC (power) "Supply Voltage Input", 2 OUT (out) "Voltage Output. VOUT is proportional to VSENSE (VRS+ - VRS-).", 3 CIN1 (in) "Comparator Input 1. Positive input of an internal comparator. The negative terminal is connected to a 0.6V internal reference.", 4 CIN2 (in) "Comparator Input 2. Terminal of a second internal comparator. The positive terminal for the MAX4374 and the negative terminal for the MAX4375. The other terminal is connected to a 0.6V internal reference.", 5 GND (power) "Ground", 6 ~{RESET} (in) "Reset Input. Resets the output latch of the comparator at CIN1.", 7 COUT2 (oc) "Open-Drain Comparator Output. Output of the second unlatched internal comparator.", 8 COUT1 (oc) "Open-Drain Comparator Output. Latching output of the comparator controlled by CIN1. Connect R\E\S\E\T\ to GND to disable the latch.", 9 RS- (in) "Load-Side Connection for the External Sense Resistor", 10 RS+ (in) "Power Connection to the External Sense Resistor"

## MAX4374HESD
designator U?
Low-cost, Micropower, High-Side Current-Sense Amplifier + 2 Comparators + Reference, 100 V / V Gain, -40 to 85 degC, 14-Pin SOIC (S14-1); PartNumber: MAX4374HESD; Bi-Dir. Curr. Sense: No; Gain: 20 V/V, 50 V/V ,100 V/V; DatasheetVersion: Rev. 4; PackageVersion: Rev. D, 10/2012; PackageReference: S14-1; PackageDescription: 14-Pin Small-Outline IC, Narrow (0.15in), Body 3.9 x 8.65 mm, Pitch 1.27 mm; Supplier Part Number 1: MAX4374HESD-ND; Supplier Part Number 2: 700-MAX4374HESD-NR; Mounting Technology: Surface Mount; Code_JEDEC: MS-012; ComponentLink1Description: Manufacturer URL; ComponentLink1URL: http://www.maximintegrated.com/; ComponentLink2Description: Datasheet; ComponentLink2URL: http://datasheets.maximintegrated.com/en/ds/MAX4373-MAX4375.pdf; ComponentLink3Description: Package Specification; ComponentLink3URL: http://pdfserv.maximintegrated.com/package_dwgs/21-0041.PDF
footprint SOIC14_1.27 (Footprint not found)
pins: 1 VCC (power) "Supply Voltage Input", 2 OUT (out) "Voltage Output. VOUT is proportional to VSENSE (VRS+ - VRS-).", 3 NC "No Connection. Not internally connected.", 4 CIN1 (in) "Comparator Input 1. Positive input of an internal comparator. The negative terminal is connected to a 0.6V internal reference.", 5 CIN2 (in) "Comparator Input 2. Terminal of a second internal comparator. The positive terminal for the MAX4374 and the negative terminal for the MAX4375. The other terminal is connected to a 0.6V internal reference.", 6 NC "No Connection. Not internally connected.", 7 GND (power) "Ground", 8 ~{RESET} (in) "Reset Input. Resets the output latch of the comparator at CIN1.", 9 NC "No Connection. Not internally connected.", 10 COUT2 (oc) "Open-Drain Comparator Output. Output of the second unlatched internal comparator.", 11 COUT1 (oc) "Open-Drain Comparator Output. Latching output of the comparator controlled by CIN1. Connect R\E\S\E\T\ to GND to disable the latch.", 12 NC "No Connection. Not internally connected.", 13 RS- (in) "Load-Side Connection for the External Sense Resistor", 14 RS+ (in) "Power Connection to the External Sense Resistor"

## MAX4374HEUB
designator U?
Low-cost, Micropower, High-Side Current-Sense Amplifier + 2 Comparators + Reference, 100 V / V Gain, -40 to 85 degC, 10-Pin SOP (U10-2); PartNumber: MAX4374HEUB; Bi-Dir. Curr. Sense: No; Gain: 20 V/V, 50 V/V ,100 V/V; DatasheetVersion: Rev. 4; PackageVersion: Rev. L, 07/2008; PackageReference: U10-2; PackageDescription: 10-Pin Micro-MAX, Thin Shrink Small-Outline (U10-2), Body 3 x 3 mm, Pitch 0.5 mm; Supplier Part Number 1: MAX4374HEUB-ND; Supplier Part Number 2: 700-MAX4374HEUB-NR; Mounting Technology: Surface Mount; Code_JEDEC: MO-187; ComponentLink1Description: Manufacturer URL; ComponentLink1URL: http://www.maximintegrated.com/; ComponentLink2Description: Datasheet; ComponentLink2URL: http://datasheets.maximintegrated.com/en/ds/MAX4373-MAX4375.pdf; ComponentLink3Description: Package Specification; ComponentLink3URL: http://pdfserv.maximintegrated.com/package_dwgs/21-0061.PDF
footprint VSSOP10_0.5 (Footprint not found)
pins: 1 VCC (power) "Supply Voltage Input", 2 OUT (out) "Voltage Output. VOUT is proportional to VSENSE (VRS+ - VRS-).", 3 CIN1 (in) "Comparator Input 1. Positive input of an internal comparator. The negative terminal is connected to a 0.6V internal reference.", 4 CIN2 (in) "Comparator Input 2. Terminal of a second internal comparator. The positive terminal for the MAX4374 and the negative terminal for the MAX4375. The other terminal is connected to a 0.6V internal reference.", 5 GND (power) "Ground", 6 ~{RESET} (in) "Reset Input. Resets the output latch of the comparator at CIN1.", 7 COUT2 (oc) "Open-Drain Comparator Output. Output of the second unlatched internal comparator.", 8 COUT1 (oc) "Open-Drain Comparator Output. Latching output of the comparator controlled by CIN1. Connect R\E\S\E\T\ to GND to disable the latch.", 9 RS- (in) "Load-Side Connection for the External Sense Resistor", 10 RS+ (in) "Power Connection to the External Sense Resistor"

## MAX4374TESD
designator U?
Low-cost, Micropower, High-Side Current-Sense Amplifier + 2 Comparators + Reference, 20 V / V Gain, -40 to 85 degC, 14-Pin SOIC (S14-1); PartNumber: MAX4374TESD; Bi-Dir. Curr. Sense: No; Gain: 20 V/V, 50 V/V ,100 V/V; DatasheetVersion: Rev. 4; PackageVersion: Rev. D, 10/2012; PackageReference: S14-1; PackageDescription: 14-Pin Small-Outline IC, Narrow (0.15in), Body 3.9 x 8.65 mm, Pitch 1.27 mm; Supplier Part Number 1: MAX4374TESD-ND; Supplier Part Number 2: 700-MAX4374TESD-NR; Mounting Technology: Surface Mount; Code_JEDEC: MS-012; ComponentLink1Description: Manufacturer URL; ComponentLink1URL: http://www.maximintegrated.com/; ComponentLink2Description: Datasheet; ComponentLink2URL: http://datasheets.maximintegrated.com/en/ds/MAX4373-MAX4375.pdf; ComponentLink3Description: Package Specification; ComponentLink3URL: http://pdfserv.maximintegrated.com/package_dwgs/21-0041.PDF
footprint SOIC14_1.27 (Footprint not found)
pins: 1 VCC (power) "Supply Voltage Input", 2 OUT (out) "Voltage Output. VOUT is proportional to VSENSE (VRS+ - VRS-).", 3 NC "No Connection. Not internally connected.", 4 CIN1 (in) "Comparator Input 1. Positive input of an internal comparator. The negative terminal is connected to a 0.6V internal reference.", 5 CIN2 (in) "Comparator Input 2. Terminal of a second internal comparator. The positive terminal for the MAX4374 and the negative terminal for the MAX4375. The other terminal is connected to a 0.6V internal reference.", 6 NC "No Connection. Not internally connected.", 7 GND (power) "Ground", 8 ~{RESET} (in) "Reset Input. Resets the output latch of the comparator at CIN1.", 9 NC "No Connection. Not internally connected.", 10 COUT2 (oc) "Open-Drain Comparator Output. Output of the second unlatched internal comparator.", 11 COUT1 (oc) "Open-Drain Comparator Output. Latching output of the comparator controlled by CIN1. Connect R\E\S\E\T\ to GND to disable the latch.", 12 NC "No Connection. Not internally connected.", 13 RS- (in) "Load-Side Connection for the External Sense Resistor", 14 RS+ (in) "Power Connection to the External Sense Resistor"

## MAX4374TEUB
designator U?
Low-cost, Micropower, High-Side Current-Sense Amplifier + 2 Comparators + Reference, 20 V / V Gain, -40 to 85 degC, 10-Pin SOP (U10-2); PartNumber: MAX4374TEUB; Bi-Dir. Curr. Sense: No; Gain: 20 V/V, 50 V/V ,100 V/V; DatasheetVersion: Rev. 4; PackageVersion: Rev. L, 07/2008; PackageReference: U10-2; PackageDescription: 10-Pin Micro-MAX, Thin Shrink Small-Outline (U10-2), Body 3 x 3 mm, Pitch 0.5 mm; Supplier Part Number 1: MAX4374TEUB-ND; Supplier Part Number 2: 700-MAX4374TEUB-NR; Mounting Technology: Surface Mount; Code_JEDEC: MO-187; ComponentLink1Description: Manufacturer URL; ComponentLink1URL: http://www.maximintegrated.com/; ComponentLink2Description: Datasheet; ComponentLink2URL: http://datasheets.maximintegrated.com/en/ds/MAX4373-MAX4375.pdf; ComponentLink3Description: Package Specification; ComponentLink3URL: http://pdfserv.maximintegrated.com/package_dwgs/21-0061.PDF
footprint VSSOP10_0.5 (Footprint not found)
pins: 1 VCC (power) "Supply Voltage Input", 2 OUT (out) "Voltage Output. VOUT is proportional to VSENSE (VRS+ - VRS-).", 3 CIN1 (in) "Comparator Input 1. Positive input of an internal comparator. The negative terminal is connected to a 0.6V internal reference.", 4 CIN2 (in) "Comparator Input 2. Terminal of a second internal comparator. The positive terminal for the MAX4374 and the negative terminal for the MAX4375. The other terminal is connected to a 0.6V internal reference.", 5 GND (power) "Ground", 6 ~{RESET} (in) "Reset Input. Resets the output latch of the comparator at CIN1.", 7 COUT2 (oc) "Open-Drain Comparator Output. Output of the second unlatched internal comparator.", 8 COUT1 (oc) "Open-Drain Comparator Output. Latching output of the comparator controlled by CIN1. Connect R\E\S\E\T\ to GND to disable the latch.", 9 RS- (in) "Load-Side Connection for the External Sense Resistor", 10 RS+ (in) "Power Connection to the External Sense Resistor"